# Altium footprint library 16-PCBa Modl.PcbLib: 81 footprints (part 6 of 6)
Each footprint in its own frame and in the unit in brackets; x right, y up, seen from the top. Pads: shape width x height; smd on the part's side, far side on the other; paste and mask are expansions set on the pad; w line width, h text height; cw(c..) or ccw(c..) is an arc to the next point about the centre after c.
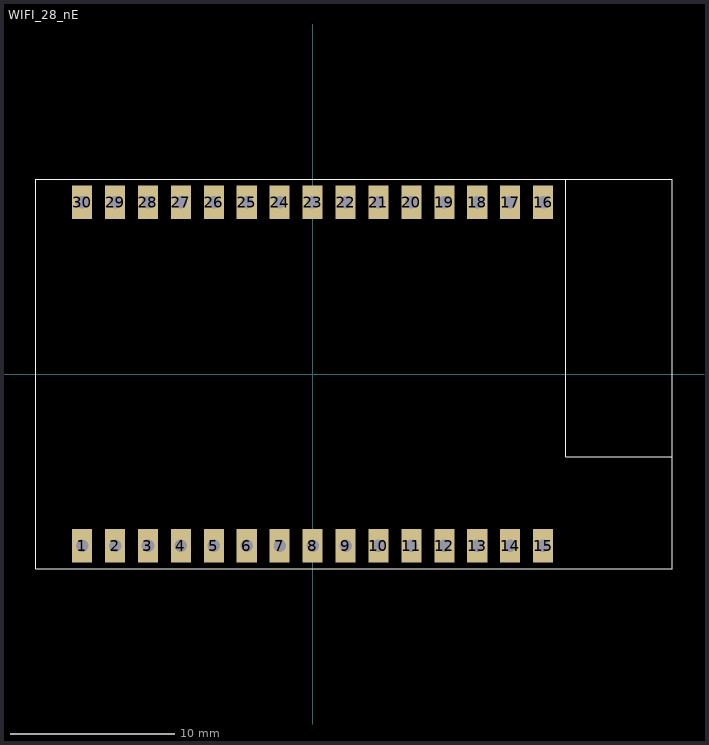
[diagram p5: the footprint, top view; thin cyan lines are the x and y axes]

## WIFI_28_nE [mm]
height 8.5
pads (30):
  rect 1.22x2.03 / inner round 1.22 / far side round 1.22 hole 0.762 mask+0.07: 1(-14,-10.44) 2(-12,-10.44) 3(-10,-10.44) 4(-8,-10.44) 5(-6,-10.44) 6(-4,-10.44) 7(-2,-10.44) 8(0,-10.44) 9(2,-10.44) 10(4,-10.44) 11(6,-10.44) 12(8,-10.44) 13(10,-10.44) 14(12,-10.44) 15(14,-10.44) 16(14,10.44) 17(12,10.44) 18(10,10.44) 19(8,10.44) 20(6,10.44) 21(4,10.44) 22(2,10.44) 23(0,10.44) 24(-2,10.44) 25(-4,10.44) 26(-6,10.44) 27(-8,10.44) 28(-10,10.44) 29(-12,10.44)
  rect 1.22x2.03 / inner round 1.22 / far side round 1.22 hole 0.762: 30(-14,10.44)
Top Overlay:
  lines w0.03: 15.392,11.836 15.392,-5.029 21.844,-5.029 ; -16.815,-11.836 21.844,-11.836 21.844,11.836 -16.815,11.836 -16.815,-11.836
3D body "1_22-2_03.stp": height 0.1, standoff -2.1, extent 11.39,9.425 12.61,11.455
3D body "1_22-2_03.stp": height 0.1, standoff -2.1, extent -14.61,-11.455 -13.39,-9.425
3D body "1_22-2_03.stp": height 0.1, standoff -2.1, extent -12.61,-11.455 -11.39,-9.425
3D body "1_22-2_03.stp": height 0.1, standoff -2.1, extent -10.61,-11.455 -9.39,-9.425
3D body "1_22-2_03.stp": height 0.1, standoff -2.1, extent -8.61,-11.455 -7.39,-9.425
3D body "1_22-2_03.stp": height 0.1, standoff -2.1, extent -6.61,-11.455 -5.39,-9.425
3D body "1_22-2_03.stp": height 0.1, standoff -2.1, extent -4.61,-11.455 -3.39,-9.425
3D body "1_22-2_03.stp": height 0.1, standoff -2.1, extent -2.61,-11.455 -1.39,-9.425
3D body "1_22-2_03.stp": height 0.1, standoff -2.1, extent -0.61,-11.455 0.61,-9.425
3D body "1_22-2_03.stp": height 0.1, standoff -2.1, extent 1.39,-11.455 2.61,-9.425
3D body "1_22-2_03.stp": height 0.1, standoff -2.1, extent 3.39,-11.455 4.61,-9.425
3D body "1_22-2_03.stp": height 0.1, standoff -2.1, extent 3.39,-11.455 4.61,-9.425
3D body "1_22-2_03.stp": height 0.1, standoff -2.1, extent 5.39,-11.455 6.61,-9.425
3D body "1_22-2_03.stp": height 0.1, standoff -2.1, extent 7.39,-11.455 8.61,-9.425
3D body "1_22-2_03.stp": height 0.1, standoff -2.1, extent 9.39,-11.455 10.61,-9.425
3D body "1_22-2_03.stp": height 0.1, standoff -2.1, extent 11.39,-11.455 12.61,-9.425
3D body "1_22-2_03.stp": height 0.1, standoff -2.1, extent 13.39,-11.455 14.61,-9.425
3D body "1_22-2_03.stp": height 0.1, standoff -2.1, extent 13.39,9.425 14.61,11.455
3D body "1_22-2_03.stp": height 0.1, standoff -2.1, extent 9.39,9.425 10.61,11.455
3D body "1_22-2_03.stp": height 0.1, standoff -2.1, extent 7.39,9.425 8.61,11.455
3D body "1_22-2_03.stp": height 0.1, standoff -2.1, extent 5.39,9.425 6.61,11.455
3D body "1_22-2_03.stp": height 0.1, standoff -2.1, extent 3.39,9.425 4.61,11.455
3D body "1_22-2_03.stp": height 0.1, standoff -2.1, extent 1.39,9.425 2.61,11.455
3D body "1_22-2_03.stp": height 0.1, standoff -2.1, extent -0.61,9.425 0.61,11.455
3D body "1_22-2_03.stp": height 0.1, standoff -2.1, extent -2.61,9.425 -1.39,11.455
3D body "1_22-2_03.stp": height 0.1, standoff -2.1, extent -4.61,9.425 -3.39,11.455
3D body "1_22-2_03.stp": height 0.1, standoff -2.1, extent -6.61,9.425 -5.39,11.455
3D body "1_22-2_03.stp": height 0.1, standoff -2.1, extent -8.61,9.425 -7.39,11.455
3D body "1_22-2_03.stp": height 0.1, standoff -2.1, extent -10.61,9.425 -9.39,11.455
3D body "1_22-2_03.stp": height 0.1, standoff -2.1, extent -12.61,9.425 -11.39,11.455
3D body "1_22-2_03.stp": height 0.1, standoff -2.1, extent -14.61,9.425 -13.39,11.455
3D body "emw3280.stp": height 3, standoff 0, extent -16.786,-11.81 21.814,11.81